# Altium footprint library Connectors.PCBLIB: 126 footprints (part 6 of 8)
Each footprint in its own frame and in the unit in brackets; x right, y up, seen from the top. Pads: shape width x height; smd on the part's side, far side on the other; paste and mask are expansions set on the pad; w line width, h text height; cw(c..) or ccw(c..) is an arc to the next point about the centre after c.
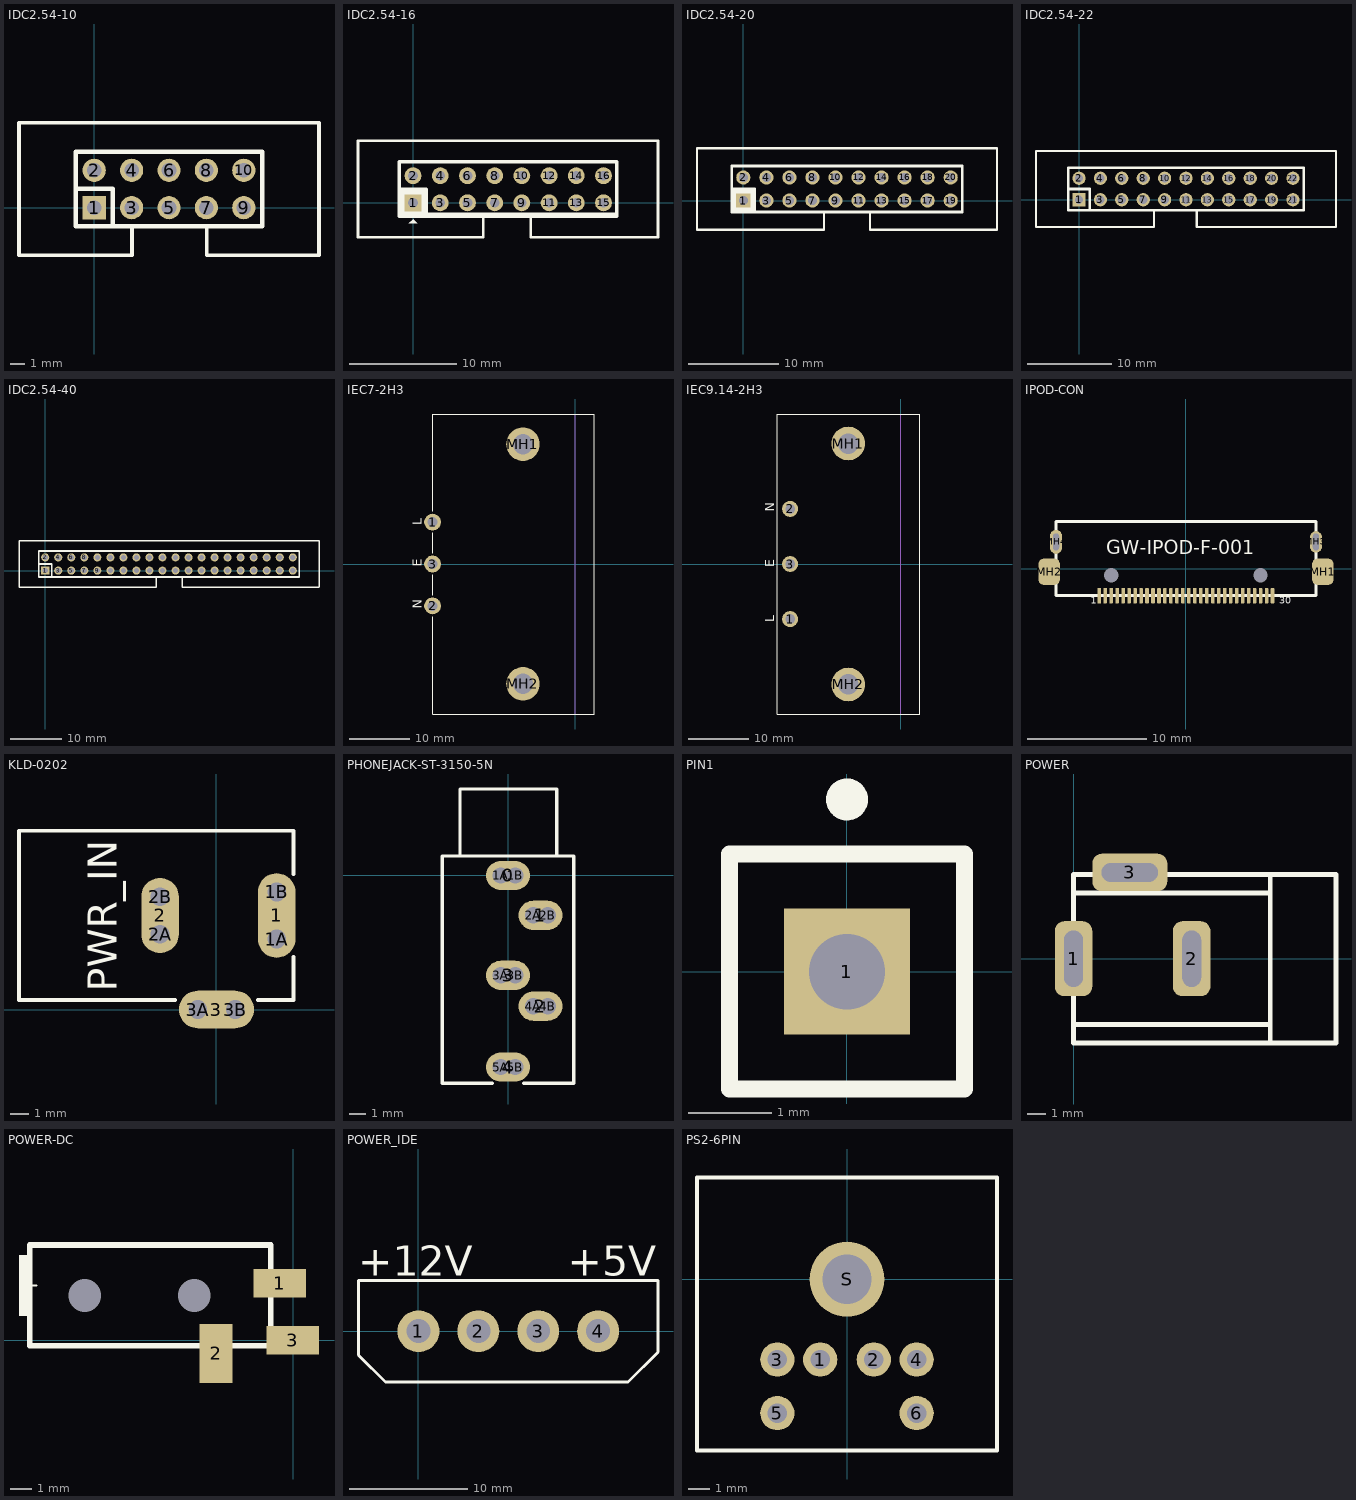
[diagram p5: the footprints below, top view; thin cyan lines are the x and y axes]

## IDC2.54-10 [mil]
pads (10):
  rect 62x62 hole 39.37: 1(0,0)
  round 62 hole 39.37: 2(0,100) 3(100,0) 4(100,100) 5(200,0) 6(200,100) 7(300,0) 8(300,100) 9(400,0) 10(400,100)
Top Overlay:
  lines w10: 101,-50 101,-127.17 -201.18,-127.17 -201.18,227.16 601.18,227.16 ; 301,-50 301,-127.17 601.18,-127.17 ; 601,-127.33 601,227
  lines w12: -50,50 50,50 50,-50 ; -50,-50 450,-50 450,150 -50,150 -50,-50
3D body "SW3dPS-HDB-10.STEP": height 366.14, standoff -98.43, extent -196.64,-128.08 598.64,242

## IDC2.54-16 [mil]
pads (16):
  rect 62x62 hole 35.43: 1(0,0)
  round 62 hole 35.43: 2(0,100) 3(100,0) 4(100,100) 5(200,0) 6(200,100) 7(300,0) 8(300,100) 9(400,0) 10(400,100) 11(500,0) 12(500,100) 13(600,0) 14(600,100) 15(700,0) 16(700,100)
Top Overlay:
  rectangle: -51,-49 48,53
  region: -15,-75 15,-75 0,-60
  lines w7.87: -50,-40 750,-40
  lines w10: 258,-49 258,-126.17 -202.18,-126.17 -202.18,228.16 900.18,228.16 900.18,-126.17 433,-126.17 433,-49
  lines w12: -51,51 49,51 49,-49 ; -51,-49 -51,151 749,151 749,-49 -51,-49

## IDC2.54-20 [mil]
pads (20):
  rect 62x62 hole 39.37: 1(0,0)
  round 62 hole 39.37: 2(0,100) 3(100,0) 4(100,100) 5(200,0) 6(200,100) 7(300,0) 8(300,100) 9(400,0) 10(400,100) 11(500,0) 12(500,100) 13(600,0) 14(600,100) 15(700,0) 16(700,100) 17(800,0) 18(800,100) 19(900,0) 20(900,100)
Top Overlay:
  rectangle: -50,-50 49,52
  lines w10: 350,-50 350,-127.17 -201.18,-127.17 -201.18,227.16 1101.18,227.16 1101.18,-127.17 550,-127.17 550,-50
  lines w12: -50,50 50,50 50,-50 ; -50,-50 -50,150 950,150 950,-50 -50,-50
3D body "SW3dPS-BH-20.STEP": height 352.36, standoff -114.17, extent -201,-123.27 1099,235

## IDC2.54-22 [mil]
pads (22):
  rect 62x62 hole 39.37: 1(0,0)
  round 62 hole 39.37: 2(0,100) 3(100,0) 4(100,100) 5(200,0) 6(200,100) 7(300,0) 8(300,100) 9(400,0) 10(400,100) 11(500,0) 12(500,100) 13(600,0) 14(600,100) 15(700,0) 16(700,100) 17(800,0) 18(800,100) 19(900,0) 20(900,100) 21(1000,0) 22(1000,100)
Top Overlay:
  lines w10: 350,-50 350,-127.17 -201.18,-127.17 -201.18,227.16 1201.18,227.16 1201.18,-127.17 550,-127.17 550,-50
  lines w12: -50,50 50,50 50,-50 ; -50,-50 -50,150 1050,150 1050,-50 -50,-50

## IDC2.54-40 [mil]
pads (40):
  rect 62x62 hole 39.37: 1(0,0)
  round 62 hole 39.37: 2(0,100) 3(100,0) 4(100,100) 5(200,0) 6(200,100) 7(300,0) 8(300,100) 9(400,0) 10(400,100) 11(500,0) 12(500,100) 13(600,0) 14(600,100) 15(700,0) 16(700,100) 17(800,0) 18(800,100) 19(900,0) 20(900,100) 21(1000,0) 22(1000,100) 23(1100,0) 24(1100,100) 25(1200,0) 26(1200,100) 27(1300,0) 28(1300,100) 29(1400,0) 30(1400,100) 31(1500,0) 32(1500,100) 33(1600,0) 34(1600,100) 35(1700,0) 36(1700,100) 37(1800,0) 38(1800,100) 39(1900,0) 40(1900,100)
Top Overlay:
  lines w10: 851,-50 851,-127.17 -201.18,-127.17 -201.18,227.16 2101.18,227.16 2101.18,-127.17 ; 1051,-50 1051,-127.17 2101,-127.17
  lines w12: -50,50 50,50 50,-50 ; 1948,-50 -50,-50 -50,150 1950,150 ; 1950,50 1950,-50 ; 1950,-50 1950,150 ; 1950,-50 1950,150
3D body "SW3dPS-HDB-40.STEP": height 366.14, standoff -98.43, extent -196.64,-126.08 2098.64,244

## IEC7-2H3 [mm] "Mains Power Outlet, IEC60 320-2-2 F, PC Flange Rear Mount"
height 30.4
pads (5):
  round 2.8 hole 1.7: 1(-23.8,7) 2(-23.8,-7) 3(-23.8,0)
  round 5.6 hole 3.4: MH1(-8.7,20) MH2(-8.7,-20)
Top Overlay:
  lines w0.2: -23.8,-8.8 -23.8,-25.05 3.2,-25.05 3.2,25.05 -23.8,25.05 -23.8,8.8 ; -23.8,-5.2 -23.8,-1.8 ; -23.8,1.8 -23.8,5.2
  text "L" at -25.6,6.5 h1.5
  text "E" at -25.6,-0.5 h1.5
  text "N" at -25.6,-7.5 h1.5
Mechanical 1:
  lines w0.1: 0,-25.05 0,25.05
  text "PCB Edge" at -0.4,-24.4 h0.5

## IEC9.14-2H3 [mm] "Mains Power Inlet, IEC60 320-1 C14, PC Flange Rear Mount"
height 27.8
pads (5):
  round 2.65 hole 1.6: 1(-18.35,-9.14) 2(-18.35,9.14) 3(-18.35,0)
  round 5.6 hole 3.4: MH1(-8.7,20) MH2(-8.7,-20)
Top Overlay:
  lines w0.2: -20.5,-24.9 3.2,-24.9 3.2,24.9 -20.5,24.9 -20.5,-24.9
  text "L" at -21,-9.64 h1.5
  text "E" at -21,-0.5 h1.5
  text "N" at -21,8.64 h1.5
Mechanical 1:
  lines w0.1: 0,-24.9 0,24.9
  text "PCB Edge" at -0.383,-24.4 h0.5

## IPOD-CON [mm]
height 2.5
pads (36):
  rect 0.3x1.3 smd: 1(-7.261,-2.25)
  rrect50% 0.3x1.3 smd: 2(-6.761,-2.25) 3(-6.261,-2.25) 4(-5.761,-2.25) 5(-5.261,-2.25) 6(-4.761,-2.25) 7(-4.261,-2.25) 8(-3.761,-2.25) 9(-3.261,-2.25) 10(-2.761,-2.25) 11(-2.261,-2.25) 12(-1.761,-2.25) 13(-1.261,-2.25) 14(-0.761,-2.25) 15(-0.261,-2.25) 16(0.239,-2.25) 17(0.739,-2.25) 18(1.239,-2.25) 19(1.739,-2.25) 20(2.239,-2.25) 21(2.739,-2.25) 22(3.239,-2.25) 23(3.739,-2.25) 24(4.239,-2.25) 25(4.739,-2.25) 26(5.239,-2.25) 27(5.739,-2.25) 28(6.239,-2.25) 29(6.739,-2.25) 30(7.239,-2.25)
  rrect50% 1.8x2.2 smd: MH1(11.45,-0.25) MH2(-11.45,-0.25)
  oval 1x1.8 hole 0.5 slot 1.4 at 90 deg: MH3(10.875,2.25)
  oval 1x2 hole 0.5 slot 1.4 at 90 deg: MH4(-10.875,2.25)
  rrect50% 0.3x0 hole 1.2: ""(-6.261,-0.55) ""(6.239,-0.55)
Top Overlay:
  lines w0.254: -10.875,-2.25 10.875,-2.25 10.875,3.95 -10.875,3.95 -10.875,-2.25
  text "1" at -7.95,-3.15 h1
  text "30" at 7.798,-3.15 h1
  text "GW-IPOD-F-001" at -6.655,0.813 h2
3D body "User Library-dock_connector.STEP": height 2.2, standoff 0, extent -11.409,-1.968 11.308,3.632

## KLD-0202 [mm] "DC Power Jack, 2.5mm, KLD Series, PCB Mount"
pads (9):
  oval 2x4.5 all layers, no hole: 1(3.2,5)
  round 1.5 hole 1: 1A(3.2,3.75) 1B(3.2,6.25) 2A(-3,4) 2B(-3,6) 3A(-1,0) 3B(1,0)
  oval 2x4 all layers, no hole: 2(-3,5)
  oval 4x2 all layers, no hole: 3(0,0)
Top Overlay:
  lines w0.2: -2.2,0.5 -10.5,0.5 -10.5,9.5 4.1,9.5 4.1,7.2 ; 2.2,0.5 4.1,0.5 4.1,2.8
  text "PWR_IN" at -5.293,0.936 h1.52
Mechanical 2:
  lines w1: -3,4 -3,6 ; -1,0 1,0 ; 3.2,3.75 3.2,6.25

## PCBComponent_1 [mm]

## PHONEJACK-ST-3150-5N [mm] "Connector; Stereo Jack, 3.5mm, 5 Position"
pads (15):
  oval 2.7x1.8 all layers, no hole: 0(0,0) 1(2,-2.45) 2(2,-8.05) 3(0,-6.15) 4(0,-11.8)
  round 1.2 hole 1: 1A(-0.45,0) 1B(0.45,0) 2A(1.55,-2.45) 2B(2.45,-2.45) 3A(-0.45,-6.15) 3B(0.45,-6.15) 4A(1.55,-8.05) 4B(2.45,-8.05) 5A(-0.45,-11.8) 5B(0.45,-11.8)
Top Overlay:
  lines w0.2: -2.96,1.263 -2.96,5.327 3.009,5.327 3.009,1.263 ; -0.95,-12.8 -4.05,-12.8 -4.05,1.2 4.05,1.2 4.05,-12.8 0.95,-12.8
Mechanical 2:
  lines w1: -0.45,-11.8 0.45,-11.8 ; -0.45,-6.15 0.45,-6.15 ; -0.45,0 0.45,0 ; 1.55,-8.05 2.45,-8.05 ; 1.55,-2.45 2.45,-2.45

## PIN1 [mm] "Connector; Coax-F"
pads (1):
  rect 1.5x1.5 hole 0.9: 1(0,0)
Top Overlay:
  circle w0.25: c0,2.05 r0.125
  lines w0.2: -1.4,-1.4 -1.4,1.4 1.4,1.4 1.4,-1.4 -1.4,-1.4
3D body "1001-1.STEP": height 8.54, standoff -3, extent -1.27,-1.27 1.27,1.27

## POWER [mm]
pads (3):
  rrect50% 2x4 hole 1 slot 3 at 90 deg: 1(0,0) 2(6.3,0)
  rrect50% 4x2 hole 1 slot 3 at 0 deg: 3(3,4.6)
Top Overlay:
  lines w0.254: 0,-3.505 10.49,-3.505 ; 0,3.505 10.49,3.505 ; 10.49,-4.496 10.49,4.496 ; 0,-4.496 0,4.496 13.995,4.496 13.995,-4.496 0,-4.496
3D body "User Library-dc range - dc connector[4840_2201].STEP": height 11.02, standoff -3.48, extent -0.043,-4.503 13.783,5.003

## POWER-DC [mm]
pads (5):
  round 0 hole 1.5 mask+0: 0(-9.521,2.057) 0(-4.521,2.057)
  rect 2.4x1.3 smd: 1(-0.621,2.607) 3(-0.021,0.007)
  rect 1.5x2.7 smd: 2(-3.521,-0.593)
Top Overlay:
  rectangle: -12.521,1.107 -11.921,3.907
  lines w0.1: -12.221,2.507 -11.721,2.507
  lines w0.254: -12.021,-0.243 -12.021,4.357 -1.021,4.357 -1.021,-0.243 -12.021,-0.243
3D body "DC.STEP": height 4.4, standoff -0.8, extent -11.996,-1.818 0.604,4.482

## POWER_IDE [mil]
pads (4):
  round 140 hole 80: 1(0,0) 2(200,0) 3(400,0) 4(600,0)
Top Overlay:
  lines w10: 640,-170 700,-170 ; 800,-40 800,-70 ; 700,-170 -110,-170 -200,-80 -200,170 800,170 800,-70 ; 700,-170 800,-70
  text "+5V" at 498,185 h100
  text "+12V" at -202,185 h100
3D body "SW3dPS-Molex disk drive power connector.STEP": height 480, standoff 0, extent -158,-174 762,176

## PS2-6PIN [mm] "PS2 Socket, 6 Pin, Through Hole"
pads (7):
  round 1.6 hole 0.9: 1(-1.25,-3.75) 2(1.25,-3.75) 3(-3.25,-3.75) 4(3.25,-3.75) 5(-3.25,-6.25) 6(3.25,-6.25)
  round 3.5 hole 2.3: S(0,0)
Top Overlay:
  lines w0.2: -7,-8 -7,4.75 7,4.75 7,-8 -7,-8